# Altium footprint library Minh_Lib.PcbLib: 141 footprints (part 5 of 9)
Each footprint in its own frame and in the unit in brackets; x right, y up, seen from the top. Pads: shape width x height; smd on the part's side, far side on the other; paste and mask are expansions set on the pad; w line width, h text height; cw(c..) or ccw(c..) is an arc to the next point about the centre after c.
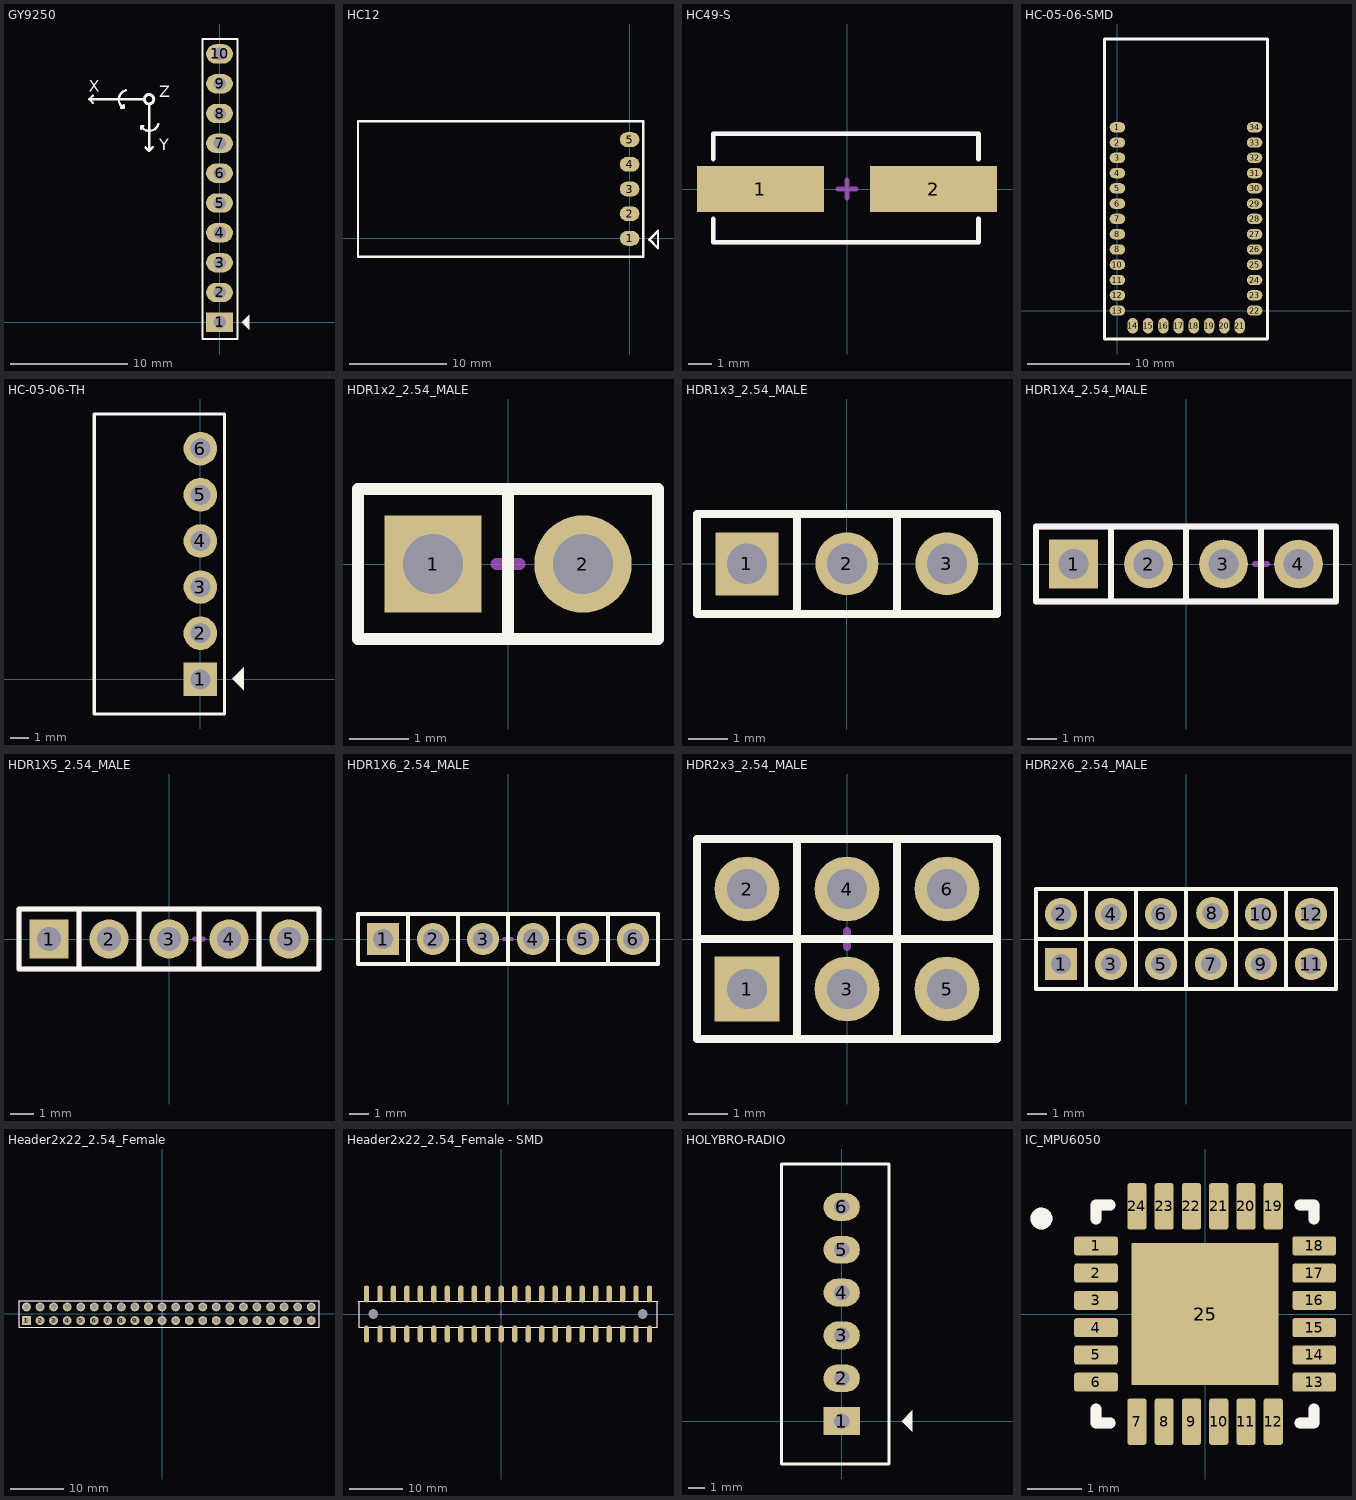
[diagram p4: the footprints below, top view; thin cyan lines are the x and y axes]

## GY9250 [mil] "GY9250"
height 200
pads (10):
  rect 90x65 hole 42: 1(0,0)
  oval 90x65 hole 42: 2(0,100) 3(0,200) 4(0,300) 5(0,400) 6(0,500) 7(0,600) 8(0,700) 9(0,800) 10(0,900)
Top Overlay:
  circle w10: c-236.22,748.03 r15.87
  region: 75,0 100,-25 100,25
  lines w7: -57,-56 -57,950 60,950 60,-56 -57,-56
  lines w7.87: -425.07,736.22 -436.89,748.03 ; -425.07,759.84 -436.89,748.03 ; -329.75,719.46 -321.42,719.46 ; -321.42,727.79 -321.42,719.46 ; -313.88,777.61 ccw(c-306.24,747.06) -321.42,719.46 ; -262.83,649.61 -262.83,658.01 ; -255.38,658.01 -262.83,658.01 ; -251.97,748.03 -436.89,748.03 ; -248.03,586.61 -236.22,574.8 ; -236.22,732.28 -236.22,574.8 ; -224.41,586.61 -236.22,574.8 ; -204.96,664.56 cw(c-235.24,673.21) -262.83,658.01
  text "X" at -438.82,773.78 h39.37
  text "Z" at -202.6,754.09 h39.37
  text "Y" at -202.6,576.93 h39.37
3D body "10-Pin Header - Female - 2.54mm.step": height 196.85, standoff -118.11, extent -49.21,-61.02 49.21,958.66
3D body "MPU-9250.stp": height 436.26, standoff -66.7, extent -531.34,-50 59.21,950

## HC12 [mil]
pads (5):
  oval 80x60 smd: 1(0,0) 2(0,100) 3(0,200) 4(0,300) 5(0,400)
Top Overlay:
  lines w10: -1100,-75 -1100,475 55,475 55,-75 -1100,-75 ; 80,-5 115,30 115,-40 80,-5
3D body "HC-12 SI4463 WIRELESS SERIAL MODULE.STEP": height 78.74, standoff 0, extent -1086.33,-61.81 -3.65,461.81

## HC49-S [mm] "Crystal SMD"
pads (2):
  rect 5.5x2 smd: 1(-3.75,0) 2(3.75,0)
Top Overlay:
  lines w0.2: -5.8,-1.3 -5.8,-2.3 5.7,-2.3 5.7,-1.3 ; -5.8,1.3 -5.8,2.4 5.7,2.4 5.7,1.3
Mechanical 13:
  lines w0.2: -5.8,-1.3 -5.8,-2.3 5.7,-2.3 5.7,-1.3 ; -5.8,1.3 -5.8,2.4 5.7,2.4 5.7,1.3
  text "'.Designator'" at -5.4,-1.68 h1.2
Mechanical 15:
  lines w0.2: -0.4,0 0,0 ; 0,-0.4 0,0 ; 0,0.4 0,0 ; 0.4,0 0,0
3D body "User Library-HC-49S.step": height 4.38, standoff 0.03, extent -6.2,-2.35 6.1,2.35

## HC-05-06-SMD [mil]
pads (34):
  oval 60x40 smd: 1(0,708.66) 2(0,649.61) 3(0,590.55) 4(0,531.5) 5(0,472.44) 6(0,413.39) 7(0,354.33) 8(0,236.22) 8(0,295.28) 10(0,177.17) 11(0,118.11) 12(0,59.06) 13(0,0) 22(530,0) 23(530,59.06) 24(530,118.11) 25(530,177.17) 26(530,236.22) 27(530,295.28) 28(530,354.33) 29(530,413.39) 30(530,472.44) 31(530,531.5) 32(530,590.55) 33(530,649.61) 34(530,708.66)
  oval 40x60 smd: 14(59.06,-59.06) 15(118.11,-59.06) 16(177.17,-59.06) 17(236.22,-59.06) 18(295.28,-59.06) 19(354.33,-59.06) 20(413.39,-59.06) 21(472.44,-59.06)
Top Overlay:
  lines w10: -50,-110 580,-110 580,1050 -50,1050 -50,-110
3D body "User Library-Bluetooth HC-06_.STEP": height 92.52, standoff 0, extent -10,-71.38 541.97,1031.38

## HC-05-06-TH [mm]
pads (6):
  rect 1.85x1.85 hole 1.1: 1(0,0)
  round 1.85 hole 1.1: 2(0,2.54) 3(0,5.08) 4(0,7.62) 5(0,10.16) 6(0,12.7)
Top Overlay:
  region: 1.753,0.025 2.388,-0.61 2.388,0.66
  lines w0.178: -5.842,-1.905 -5.842,14.605 1.321,14.605 1.321,-1.905 -5.842,-1.905
3D body "6-Pin Header - Female - 2.54mm.step": height 5, standoff -3, extent -1.25,-1.52 1.25,14.22
3D body "hc05.STEP": height 41, standoff -1.6, extent -5.55,-1.65 0.35,14.45

## HDR1x2_2.54_MALE [mm] "Header2x1 2.54 MALE"
pads (2):
  rect 1.65x1.65 hole 1.02: 1(-1.27,0)
  round 1.65 hole 1.02: 2(1.27,0)
Top Overlay:
  lines w0.2: 0,-1.27 0,1.27 ; -2.54,-1.27 2.54,-1.27 2.54,1.27 -2.54,1.27 -2.54,-1.27
Mechanical 13:
  lines w0.2: 0,-1.27 0,1.27 ; -2.54,-1.27 2.54,-1.27 2.54,1.27 -2.54,1.27 -2.54,-1.27
  text "'.Designator'" at -2.5,-0.6 h0.7
Mechanical 15:
  lines w0.2: -0.2,0 0.2,0 ; 0,-0.2 0,0.3
3D body "2x_Male_Pin_2.54_mm.STEP": height 8.36, standoff -2.74, extent -2.54,-1.2 2.54,1.2

## HDR1x3_2.54_MALE [mm] "Header 2.54 MALE"
pads (3):
  rect 1.6x1.6 hole 1.02: 1(-2.54,0)
  round 1.6 hole 1.02: 2(0,0) 3(2.54,0)
Top Overlay:
  lines w0.2: -1.27,-1.27 -1.27,1.27 ; -1.267,-1.28 -1.267,1.26 ; 1.27,-1.27 1.27,1.27 ; 1.273,-1.28 1.273,1.26 ; -3.81,-1.27 -3.81,1.27 3.81,1.27 3.81,-1.27 -3.81,-1.27 ; -3.807,-1.28 -3.807,1.26 3.813,1.26 3.813,-1.28 -3.807,-1.28
Mechanical 13:
  lines w0.2: -1.27,-1.27 -1.27,1.27 ; 1.27,-1.27 1.27,1.27 ; -3.81,-1.27 -3.81,1.27 3.81,1.27 3.81,-1.27 -3.81,-1.27
  text "'.Designator'" at -3.6,-0.267 h0.7
Mechanical 15:
  lines w0.2: -0.3,0 0.3,0 ; 0,-0.3 0,0.3
3D body "3x_Male_Pin_2.54_mm.STEP": height 8.36, standoff -2.74, extent -3.81,-1.2 3.81,1.2

## HDR1X4_2.54_MALE [mm] "Header1x4 2.54 Male"
pads (4):
  rect 1.65x1.65 hole 1.02: 1(-3.81,0)
  round 1.65 hole 1.02: 2(-1.27,0) 3(1.27,0) 4(3.81,0)
Top Overlay:
  lines w0.2: -2.54,-1.27 -2.54,1.27 ; 0,-1.27 0,1.27 ; 2.54,-1.27 2.54,1.27 ; -5.08,-1.27 5.08,-1.27 5.08,1.27 -5.08,1.27 -5.08,-1.27
Mechanical 13:
  lines w0.2: -2.54,-1.27 -2.54,1.27 ; 0,-1.27 0,1.27 ; 2.54,-1.27 2.54,1.27 ; -5.08,-1.27 5.08,-1.27 5.08,1.27 -5.08,1.27 -5.08,-1.27
  text "'.Designator'" at -4.87,-0.2 h0.9
Mechanical 15:
  lines w0.2: 2.34,0 2.74,0 ; 2.54,-0.2 2.54,0.2
3D body "4x_Male_Pin_2.54_mm.STEP": height 8.36, standoff -2.74, extent -5.08,-1.2 5.08,1.2

## HDR1X5_2.54_MALE [mm] "Header1x5 2.54 Male"
pads (5):
  rect 1.65x1.65 hole 1.02: 1(-5.08,0)
  round 1.65 hole 1.02: 2(-2.54,0) 3(0,0) 4(2.54,0) 5(5.08,0)
Top Overlay:
  lines w0.2: -3.81,-1.27 -3.81,1.27 ; -1.27,-1.27 -1.27,1.27 ; 1.27,-1.27 1.27,1.27 ; 3.81,-1.27 3.81,1.27 ; -6.35,-1.27 6.35,-1.27 6.35,1.27 -6.35,1.27 -6.35,-1.27
Mechanical 13:
  lines w0.2: -3.81,-1.27 -3.81,1.27 ; -1.27,-1.27 -1.27,1.27 ; 1.27,-1.27 1.27,1.27 ; 3.81,-1.27 3.81,1.27 ; -6.35,-1.27 6.35,-1.27 6.35,1.27 -6.35,1.27 -6.35,-1.27
  text "'.Designator'" at -6.14,-0.2 h0.9
Mechanical 15:
  lines w0.2: 1.07,0 1.47,0 ; 1.27,-0.2 1.27,0.2
3D body "5x_Male_Pin_2.54_mm.STEP": height 8.36, standoff -2.74, extent -6.35,-1.2 6.35,1.2

## HDR1X6_2.54_MALE [mm] "Header1x6 2.54 Male"
pads (6):
  rect 1.65x1.65 hole 1.02: 1(-6.35,0)
  round 1.65 hole 1.02: 2(-3.81,0) 3(-1.27,0) 4(1.27,0) 5(3.81,0) 6(6.35,0)
Top Overlay:
  lines w0.2: -5.08,-1.27 -5.08,1.27 ; -2.54,-1.27 -2.54,1.27 ; 0,-1.27 0,1.27 ; 2.54,-1.27 2.54,1.27 ; 5.08,-1.27 5.08,1.27 ; -7.62,-1.27 -7.62,1.27 7.62,1.27 7.62,-1.27 -7.62,-1.27
Mechanical 13:
  lines w0.2: -5.08,-1.27 -5.08,1.27 ; -2.54,-1.27 -2.54,1.27 ; 0,-1.27 0,1.27 ; 2.54,-1.27 2.54,1.27 ; 5.08,-1.27 5.08,1.27 ; -7.62,-1.27 -7.62,1.27 7.62,1.27 7.62,-1.27 -7.62,-1.27
  text "'.Designator'" at -7.41,-0.2 h0.9
Mechanical 15:
  lines w0.2: -0.2,0 0.2,0 ; 0,-0.2 0,0.2
3D body "6x_Male_Pin_2.54_mm.STEP": height 8.36, standoff -2.74, extent -7.62,-1.2 7.62,1.2

## HDR2x3_2.54_MALE [mm] "Header 2x3 2.54 MALE"
pads (6):
  rect 1.65x1.65 hole 1.02: 1(-2.54,-1.27)
  round 1.65 hole 1.02: 2(-2.54,1.27) 3(0,-1.27) 4(0,1.27) 5(2.54,-1.27) 6(2.54,1.27)
Top Overlay:
  lines w0.2: -3.81,0 3.81,0 ; -1.27,-2.54 -1.27,2.54 ; 1.27,-2.54 1.27,2.54 ; -3.81,-2.54 -3.81,2.54 3.81,2.54 3.81,-2.54 -3.81,-2.54
Mechanical 13:
  lines w0.2: -3.81,0 3.81,0 ; -1.27,-2.54 -1.27,2.54 ; 1.27,-2.54 1.27,2.54 ; -3.81,-2.54 -3.81,2.54 3.81,2.54 3.81,-2.54 -3.81,-2.54
  text "'.Designator'" at -3.71,-0.302 h0.7
  text "1" at -2.1,-3.2 h0.9
Mechanical 15:
  lines w0.2: -0.2,0 0.2,0 ; 0,-0.2 0,0.2
3D body "3x_Male_Pin_2.54_mm.STEP": height 8.36, standoff -2.74, extent -3.81,0.1 3.81,2.5
3D body "3x_Male_Pin_2.54_mm.STEP": height 8.36, standoff -2.74, extent -3.81,-2.5 3.81,-0.1

## HDR2X6_2.54_MALE [mm] "Header2x6 2.54 Male"
pads (12):
  rect 1.65x1.65 hole 1.02: 1(-6.35,-1.27)
  round 1.65 hole 1.02: 2(-6.35,1.27) 3(-3.81,-1.27) 4(-3.81,1.27) 5(-1.27,-1.27) 6(-1.27,1.27) 7(1.27,-1.27) 8(1.339,1.317) 9(3.81,-1.27) 10(3.81,1.27) 11(6.35,-1.27) 12(6.35,1.27)
Top Overlay:
  lines w0.2: -7.62,0 7.62,0 ; -5.08,-2.54 -5.08,2.54 ; -2.54,-2.54 -2.54,2.54 ; 0,-2.54 0,2.54 ; 2.54,-2.54 2.54,2.54 ; 5.08,-2.54 5.08,2.54 ; -7.62,-2.54 7.62,-2.54 7.62,2.54 -7.62,2.54 -7.62,-2.54
Mechanical 13:
  lines w0.2: -7.62,0 7.62,0 ; -5.08,-2.54 -5.08,2.54 ; -2.54,-2.54 -2.54,2.54 ; 0,-2.54 0,2.54 ; 2.54,-2.54 2.54,2.54 ; 5.08,-2.54 5.08,2.54 ; -7.62,-2.54 7.62,-2.54 7.62,2.54 -7.62,2.54 -7.62,-2.54
  text "'.Designator'" at -7.52,-0.235 h0.9
  text "1" at -5.9,-3.1 h0.9
Mechanical 15:
  lines w0.2: -0.3,0 0.3,0 ; 0,-0.3 0,0.3
3D body "6x_Male_Pin_2.54_mm.STEP": height 8.36, standoff -2.74, extent -7.62,0.1 7.62,2.5
3D body "6x_Male_Pin_2.54_mm.STEP": height 8.36, standoff -2.74, extent -7.62,-2.5 7.62,-0.1

## Header2x22_2.54_Female [mm] "DIP"
pads (44):
  rect 1.65x1.65 hole 1.02: 1(-25.4,-1.27)
  round 1.65 hole 1.02: 2(-22.86,-1.27) 3(-20.32,-1.27) 4(-17.78,-1.27) 5(-15.24,-1.27) 6(-12.7,-1.27) 7(-10.16,-1.27) 8(-7.62,-1.27) 9(-5.08,-1.27) 10(-2.54,-1.27) 11(0,-1.27) 12(2.54,-1.27) 13(5.08,-1.27) 14(7.62,-1.27) 15(10.16,-1.27) 16(12.7,-1.27) 17(15.24,-1.27) 18(17.78,-1.27) 19(20.32,-1.27) 20(22.86,-1.27) 21(25.4,-1.27) 22(27.94,-1.27) 23(27.94,1.27) 24(25.4,1.27) 25(22.86,1.27) 26(20.32,1.27) 27(17.78,1.27) 28(15.24,1.27) 29(12.7,1.27) 30(10.16,1.27) 31(7.62,1.27) 32(5.08,1.27) 33(2.54,1.27) 34(0,1.27) 35(-2.54,1.27) 36(-5.08,1.27) 37(-7.62,1.27) 38(-10.16,1.27) 39(-12.7,1.27) 40(-15.24,1.27) 41(-17.78,1.27) 42(-20.32,1.27) 43(-22.86,1.27) 44(-25.4,1.27)
Top Overlay:
  lines w0.2: -26.8,-2.5 29.4,-2.5 29.4,2.4 -26.8,2.4 -26.8,-2.5
Mechanical 13:
  lines w0.2: -26.8,-2.5 29.4,-2.5 29.4,2.4 -26.8,2.4 -26.8,-2.5
  text "'.Designator'" at -26.72,-1.802 h1.9
Mechanical 15:
  lines w0.2: -0.6,0 0,0 ; 0,-0.6 0,0 ; 0,0.6 0,0 ; 0.6,0 0,0
3D body "female_header_a-bl254-dg-g44d.stp": height 8.5, standoff -3.2, extent -26.77,-2.55 29.36,2.45

## Header2x22_2.54_Female - SMD [mm] "SMD"
pads (46):
  oval 1.02x3.2 smd: 1(-25.4,-3.775) 2(-22.86,-3.775) 3(-20.32,-3.775) 4(-17.78,-3.775) 5(-15.24,-3.775) 6(-12.7,-3.775) 7(-10.16,-3.775) 8(-7.62,-3.775) 9(-5.08,-3.775) 10(-2.54,-3.775) 11(0,-3.775) 12(2.54,-3.775) 13(5.08,-3.775) 14(7.62,-3.775) 15(10.16,-3.775) 16(12.7,-3.775) 17(15.24,-3.775) 18(17.78,-3.775) 19(20.32,-3.775) 20(22.86,-3.775) 21(25.4,-3.775) 22(27.94,-3.775) 23(27.94,3.775) 24(25.4,3.775) 25(22.86,3.775) 26(20.32,3.775) 27(17.78,3.775) 28(15.24,3.775) 29(12.7,3.775) 30(10.16,3.775) 31(7.62,3.775) 32(5.08,3.775) 33(2.54,3.775) 34(0,3.775) 35(-2.54,3.775) 36(-5.08,3.775) 37(-7.62,3.775) 38(-10.16,3.775) 39(-12.7,3.775) 40(-15.24,3.775) 41(-17.78,3.775) 42(-20.32,3.775) 43(-22.86,3.775) 44(-25.4,3.775)
  round 1.524 hole 1.8: ""(-24.13,0) ""(26.67,0)
Top Overlay:
  lines w0.2: -26.8,-2.5 -26.8,2.4 29.4,2.4 29.4,-2.5 -26.8,-2.5
Mechanical 13:
  lines w0.2: -26.8,-2.5 -26.8,2.4 29.4,2.4 29.4,-2.5 -26.8,-2.5
  text "'.Designator'" at -26.72,-1.802 h1.9
Mechanical 15:
  lines w0.2: -0.6,0 0,0 ; 0,-0.6 0,0 ; 0,0.6 0,0 ; 0.6,0 0,0
3D body "female_header_a-bl254-dg-g44mp1.stp": height 5.1, standoff 0, extent -26.95,-3.3 29.43,3.3

## HOLYBRO-RADIO [mil] "JP6"
height 200
pads (6):
  rect 85x65 hole 36: 1(0,0)
  oval 85x65 hole 36: 2(0,100) 3(0,200) 4(0,300) 5(0,400) 6(0,500)
Top Overlay:
  region: 140,0 165,-25 165,25
  lines w7: -140,-100 -140,600 110,600 110,-100 -140,-100
3D body "JST - XH - Thru (V) - 6Pin - 2.54mm.stp": height 284, standoff -118, extent -135,-92 95,592

## IC_MPU6050 [mm]
pads (25):
  rrect25% 0.8x0.35 smd: 1(-2,1.25) 2(-2,0.75) 3(-2,0.25) 4(-2,-0.25) 5(-2,-0.75) 6(-2,-1.25) 13(2,-1.25) 14(2,-0.75) 15(2,-0.25) 16(2,0.25) 17(2,0.75) 18(2,1.25)
  rrect25% 0.35x0.85 smd: 7(-1.25,-1.975) 8(-0.75,-1.975) 9(-0.25,-1.975) 10(0.25,-1.975) 11(0.75,-1.975) 12(1.25,-1.975) 19(1.25,1.975) 20(0.75,1.975) 21(0.25,1.975) 22(-0.25,1.975) 23(-0.75,1.975) 24(-1.25,1.975)
  rect 2.7x2.6 smd paste-2: 25(0,0)
Top Overlay:
  circle w0.2: c-3,1.75 r0.1
  lines w0.2: -2,-1.739 -2,-2 -1.739,-2 ; -2,1.739 -2,2 -1.739,2 ; 1.739,-2 2,-2 2,-1.739 ; 1.739,2 2,2 2,1.739
Top Paste:
  region: 0.854,-0.822 -0.854,-0.822 -0.854,0.822 0.854,0.822
Mechanical 13:
  circle w0.2: c-3,1.75 r0.1
  lines w0.2: -2,-1.739 -2,-2 -1.739,-2 ; -2,1.739 -2,2 -1.739,2 ; 1.739,-2 2,-2 2,-1.739 ; 1.739,2 2,2 2,1.739
  text "'.Designator'" at -1.297,-0.148 h0.4
Mechanical 15:
  lines w0.2: -0.381,0 0,0 ; 0,-0.381 0,0 ; 0,0.381 0,0 ; 0.381,0 0,0
3D body "User Library-mpu-6050_qfn-24-1.step": height 0.88, standoff -0.02, extent -2.02,-2.008 2.02,2.032